# Altium footprint library EPCOS.PcbLib: 178 footprints (part 6 of 12)
Each footprint in its own frame and in the unit in brackets; x right, y up, seen from the top. Pads: shape width x height; smd on the part's side, far side on the other; paste and mask are expansions set on the pad; w line width, h text height; cw(c..) or ccw(c..) is an arc to the next point about the centre after c.
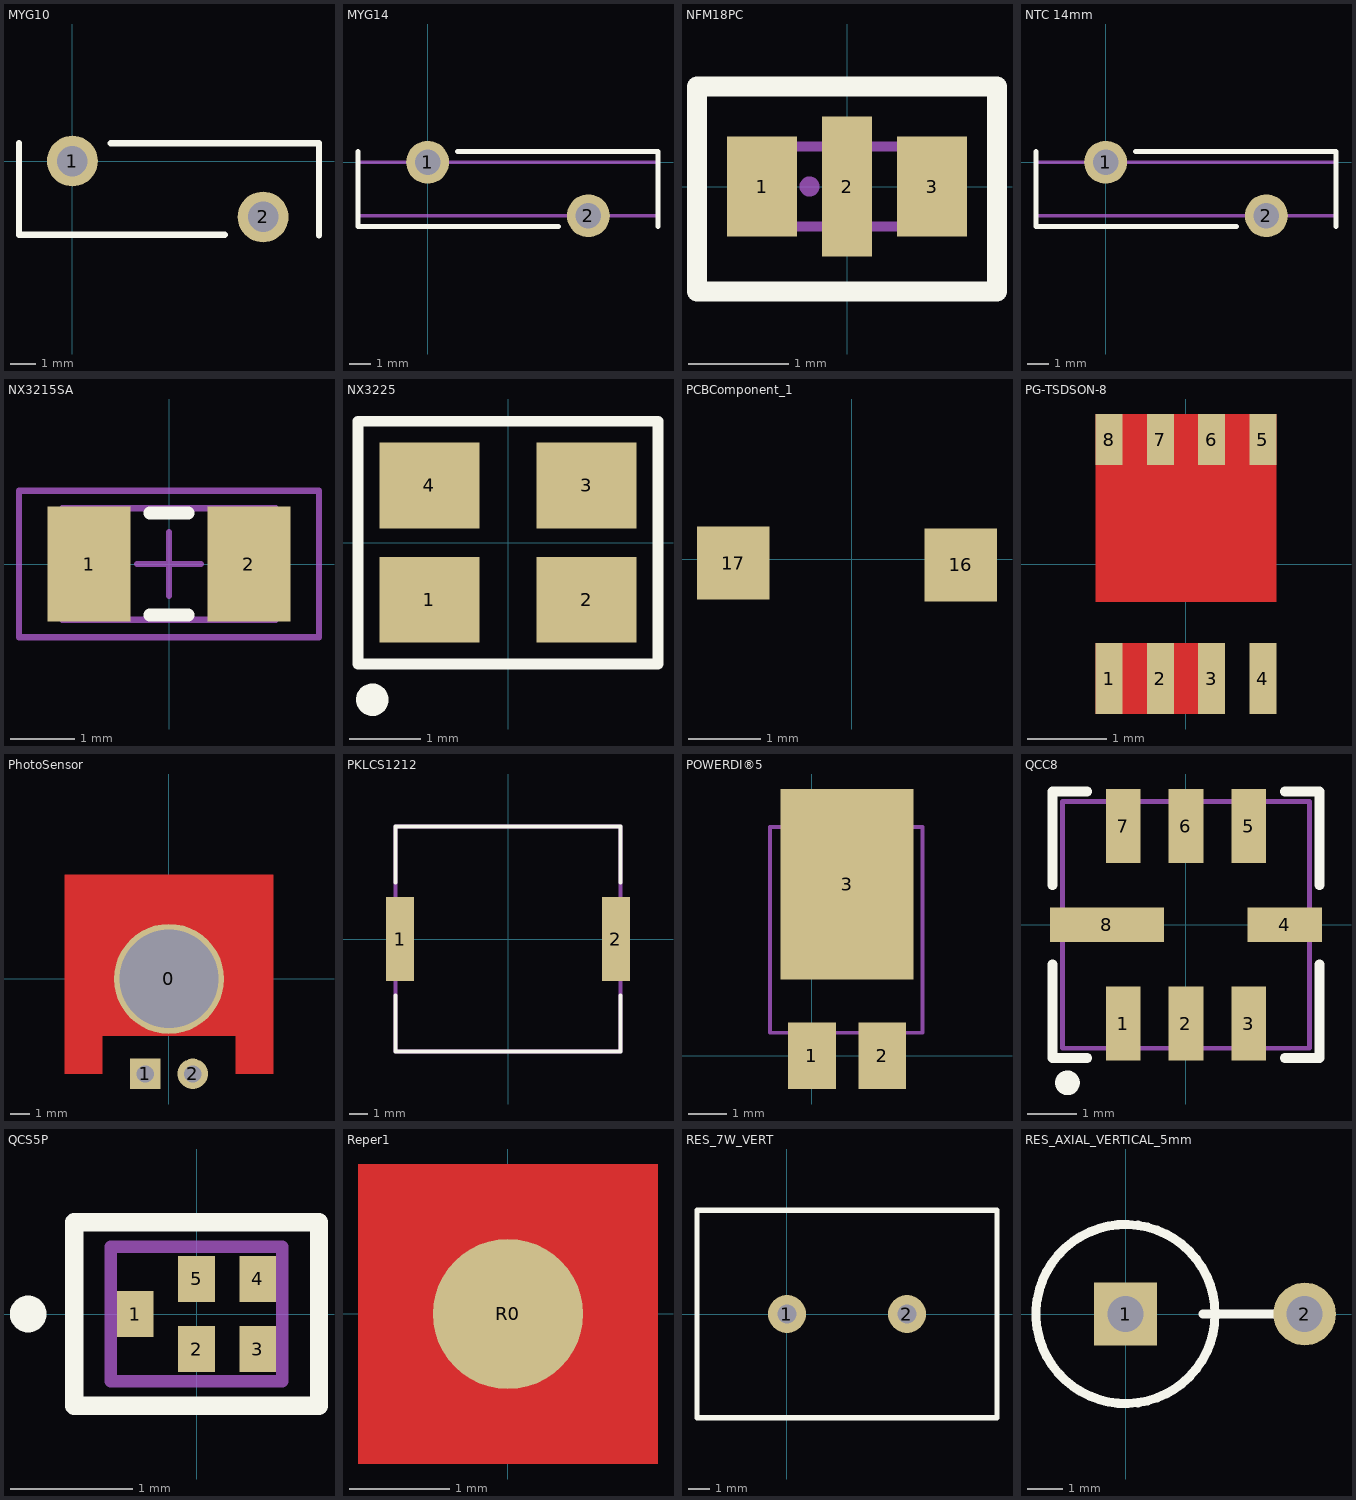
[diagram p5: the footprints below, top view; thin cyan lines are the x and y axes]

## MYG10 [mm]
height 15.24
pads (2):
  round 2 hole 1.2: 1(0,0) 2(7.5,-2.2)
Top Overlay:
  lines w0.254: -2.1,0.7 -2.1,-2.9 6,-2.9 ; 1.5,0.7 9.7,0.7 9.7,-2.921
3D body "User Library-S10K275.STEP": height 14, standoff -1.5, extent -2.2,-2.999 9.8,0.801

## MYG14 [mm]
height 15.24
pads (2):
  round 2 hole 1.2: 1(0,0) 2(7.5,-2.5)
Top Overlay:
  lines w0.254: -3.25,0.5 -3.25,-3 6.1,-3 ; 1.4,0.5 10.75,0.5 10.75,-3
Mechanical 13:
  lines w0.178: -3.25,-2.5 -3.25,0 10.75,0 10.75,-2.5 -3.25,-2.5
3D body "User Library-S14K25 MOV.step": height 19.5, standoff -2, extent -4.05,-3.3 11.45,0.9

## NFM18PC [mm] "Chip Capacitor EMI, 0603size, Body 1.6x0.8mm"
height 0.8
pads (3):
  rect 0.7x1 smd mask+0.1: 1(-0.85,0) 3(0.85,0)
  rect 0.5x1.4 smd mask+0.1: 2(0,0)
Top Overlay:
  lines w0.2: -1.5,-1.05 1.5,-1.05 1.5,1 -1.5,1 -1.5,-1.05
Mechanical 4:
  circle w0.1: c-0.375,0 r0.05
  lines w0.1: -0.55,-0.4 -0.55,0.4 ; -0.2,-0.4 -0.2,0.4 ; 0.2,-0.4 0.2,0.4 ; 0.55,-0.4 0.55,0.4 ; -0.8,-0.4 0.8,-0.4 0.8,0.4 -0.8,0.4 -0.8,-0.4
3D body "User Library-Murata_NFM18PC_4Amp.STEP": height 0.8, standoff 0, extent -0.8,-0.4 0.8,0.4

## NTC 14mm [mm]
height 15
pads (2):
  round 2 hole 1.2: 1(0,0) 2(7.5,-2.5)
Top Overlay:
  lines w0.254: -3.25,0.5 -3.25,-3 6.1,-3 ; 1.4,0.5 10.75,0.5 10.75,-3
Mechanical 13:
  lines w0.178: -3.25,-2.5 10.75,-2.5 10.75,0 -3.25,0 -3.25,-2.5
3D body "User Library-S14K25 MOV.step": height 19.5, standoff -2, extent -4.05,-3.3 11.45,0.9

## NX3215SA [mm]
height 0.8
pads (2):
  rect 1.3x1.8 smd: 1(-1.25,0) 2(1.25,0)
Top Overlay:
  lines w0.2: -0.3,-0.8 0.3,-0.8 ; -0.3,0.8 0.3,0.8
Mechanical 13:
  lines w0.1: -1.675,-0.875 1.675,-0.875 1.675,0.875 -1.675,0.875 -1.675,-0.875
Mechanical 15:
  lines w0.1: -0.5,0 0.5,0 ; 0,-0.5 0,0.5 ; -2.35,-1.15 -2.35,1.15 2.35,1.15 2.35,-1.15 -2.35,-1.15
3D body "User Library-ABS07.STEP": height 0.91, standoff 0, extent -1.61,-0.76 1.61,0.76

## NX3225 [mm] "NX3225 series Crystal Oscillator"
height 0.8
pads (4):
  rect 1.4x1.2 smd: 1(-1.1,-0.8) 2(1.1,-0.8) 3(1.1,0.8) 4(-1.1,0.8)
Top Overlay:
  circle w0.254: c-1.9,-2.2 r0.1
  lines w0.15: -2.1,-1.7 -2.1,1.7 2.1,1.7 2.1,-1.7 -2.1,-1.7
3D body "User Library-NX3225GB.step": height 0.75, standoff 0, extent -1.6,-1.25 1.6,1.25

## PCBComponent_1 [mm]
pads (2):
  rect 1x1 / inner rect 1x1 / far side rect 0x0 all layers, no hole: 16(1.5,-0.075) 17(-1.625,-0.05)

## PG-TSDSON-8 [mm]
height 1
pads (8):
  rect 0.34x0.9 smd paste-1 mask+0.05: 1(-0.975,-1.45) 2(-0.325,-1.45) 3(0.325,-1.45) 4(0.975,-1.45)
  rect 0.34x0.65 smd paste-1 mask+0.05: 5(0.975,1.58) 6(0.325,1.58) 7(-0.325,1.58) 8(-0.975,1.58)
Top Layer:
  rectangle: -1.145,-0.48 1.145,1.905
  rectangle: -1.145,-1.9 0.495,-1
Top Paste:
  region: -0.42,-1.055 -1.09,-1.055 -1.09,-1.255 -0.42,-1.255
  region: 0.445,-1.055 -0.225,-1.055 -0.225,-1.255 0.445,-1.255
  region: 1.095,-1.15 0.855,-1.15 0.855,-1.85 1.095,-1.85
  region: 0.445,-1.55 0.205,-1.55 0.205,-1.85 0.445,-1.85
  region: -0.205,-1.55 -0.445,-1.55 -0.445,-1.85 -0.205,-1.85
  region: -0.855,-1.55 -1.095,-1.55 -1.095,-1.85 -0.855,-1.85
  rectangle: -0.545,-0.35 0.545,1.05
  rectangle: 0.855,1.28 1.095,1.88
  rectangle: 0.205,1.28 0.445,1.88
  rectangle: -0.445,1.28 -0.205,1.88
  rectangle: -1.095,1.28 -0.855,1.88
  rectangle: 0.855,-0.35 1.095,1.05
  region: -0.855,1.05 -1.095,1.05 -1.095,-0.35 -0.855,-0.35
Top Solder:
  rectangle: -1.195,-0.53 1.195,1.25
  rectangle: -1.195,-1.4 0.545,-0.95
3D body "User Library-PG-TSDSON-8-1.STEP": height 1.11, standoff 0, extent -1.7,-1.7 1.7,1.7

## PhotoSensor [mm]
height 10
pads (3):
  round 5.8 hole 5.2 unplated: 0(0,0)
  rect 1.6x1.6 hole 0.9 unplated: 1(-1.25,-5)
  round 1.6 hole 0.9 unplated: 2(1.25,-5)
Top Layer:
  rectangle: -5.5,-5 -3.5,4.5
  rectangle: 3.5,-5 5.5,4.5
  region: 5.5,3.5 5.5,5.5 -5.5,5.5 -5.5,3.5
  rectangle: -3.5,-3 3.5,3.5
Top Solder:
  region: 5.5,3.5 5.5,5.5 -5.5,5.5 -5.5,3.5
  region: 5.5,4.5 3.5,4.5 3.5,-5 5.5,-5
  region: -3.5,4.5 -5.5,4.5 -5.5,-5 -3.5,-5

## PKLCS1212 [mm] "Murata SMD Buzzer"
height 3
pads (2):
  rect 1.5x4.5 smd: 1(-5.75,0) 2(5.75,0)
Top Overlay:
  lines w0.2: -6,-3 -6,-6 6,-6 6,-3 ; -6,3 -6,6 6,6 6,3
Mechanical 1:
  lines w0.2: -6,-6 -6,6 6,6 6,-6 -6,-6
3D body "User Library-PKLCS1212E2XXX.STEP": height 3, standoff 0, extent -6,-6 6,6

## POWERDI®5 [mm] "POWERDI®5 package"
height 1.15
pads (3):
  rect 1.25x1.75 smd: 1(0,0) 2(1.85,0)
  rect 3.5x5 smd: 3(0.92,4.5)
Mechanical 13:
  lines w0.1: -1.1,0.6 2.9,0.6 2.9,6 -1.1,6 -1.1,0.6 ; -0.4,0 0.4,0 0.4,0.6 -0.4,0.6 -0.4,0 ; 0,6 0,6.6 1.8,6.6 1.8,6 0,6 ; 1.45,0 1.45,0.6 2.25,0.6 2.25,0 1.45,0
3D body "PowerDI5.stp": height 1.12, standoff 0.02, extent -1.085,-0.1 2.885,6.408

## QCC8 [mm] "QCC8 SAW Filter Case"
height 1.8
pads (8):
  rect 0.7x1.5 smd paste+0 mask+0: 1(-1.27,-2) 2(0,-2) 3(1.27,-2) 5(1.27,2) 6(0,2) 7(-1.27,2)
  rect 1.5x0.7 smd paste+0 mask+0: 4(2,0)
  rect 2.3x0.7 smd paste+0 mask+0: 8(-1.6,0)
Top Overlay:
  circle w0.25: c-2.4,-3.2 r0.125
  lines w0.2: -2.7,-0.8 -2.7,-2.7 -2,-2.7 ; -2.7,0.8 -2.7,2.7 -2,2.7 ; 2,-2.7 2.7,-2.7 2.7,-0.8 ; 2,2.7 2.7,2.7 2.7,0.8
Mechanical 15:
  lines w0.1: -2.5,-2.5 2.5,-2.5 2.5,2.5 -2.5,2.5 -2.5,0 -2.5,-2.5
3D body "User Library-QCC8C.STEP": height 1.37, standoff -0.09, extent -2.515,-2.5 2.485,2.5

## QCS5P [mm]
height 0.45
pads (5):
  rect 0.3x0.375 smd paste+0 mask+0: 1(-0.5,0) 2(0,-0.288) 3(0.5,-0.288) 4(0.5,0.288) 5(0,0.288)
Top Overlay:
  circle w0.15: c-1.375,0 r0.075
  lines w0.15: -1,-0.75 -1,0.75 1,0.75 1,-0.75 -1,-0.75
Mechanical 15:
  lines w0.1: -0.7,-0.55 0.7,-0.55 0.7,0.55 -0.7,0.55 -0.7,-0.55
3D body "User Library-QCS5P-1.step": height 0.4, standoff -0.02, extent -0.7,-0.55 0.7,0.55

## Reper1 [mm]
pads (1):
  round 1.5 smd paste-2539.97 mask+0: R0(0,0)
Top Layer:
  pour cut-out: -1.5,1.5 -1.5,-1.5 1.5,-1.5 1.5,1.5
Top Solder:
  rectangle: -1.5,-1.5 1.5,1.5

## RES_7W_VERT [mil]
height 1535
pads (2):
  round 70 hole 35.43: 1(0,0) 2(220,0)
Top Overlay:
  lines w10: -165,-190 -165,190 385,190 385,-190 -165,-190

## RES_AXIAL_VERTICAL_5mm [mm]
height 20
pads (2):
  rect 1.75x1.75 hole 1: 1(0,0)
  round 1.75 hole 1: 2(5,0)
Top Overlay:
  circle w0.254: c0,0 r2.5
  lines w0.254: 2.159,0 5.461,0
3D body "User Library-Axial Resistor-Vertical_414x50.step": height 14.42, standoff -1.41, extent -2.199,-2.159 5.447,2.159